# Altium footprint library PRL_PDC.PcbLib: 77 footprints (part 1 of 5)
Each footprint in its own frame and in the unit in brackets; x right, y up, seen from the top. Pads: shape width x height; smd on the part's side, far side on the other; paste and mask are expansions set on the pad; w line width, h text height; cw(c..) or ccw(c..) is an arc to the next point about the centre after c.
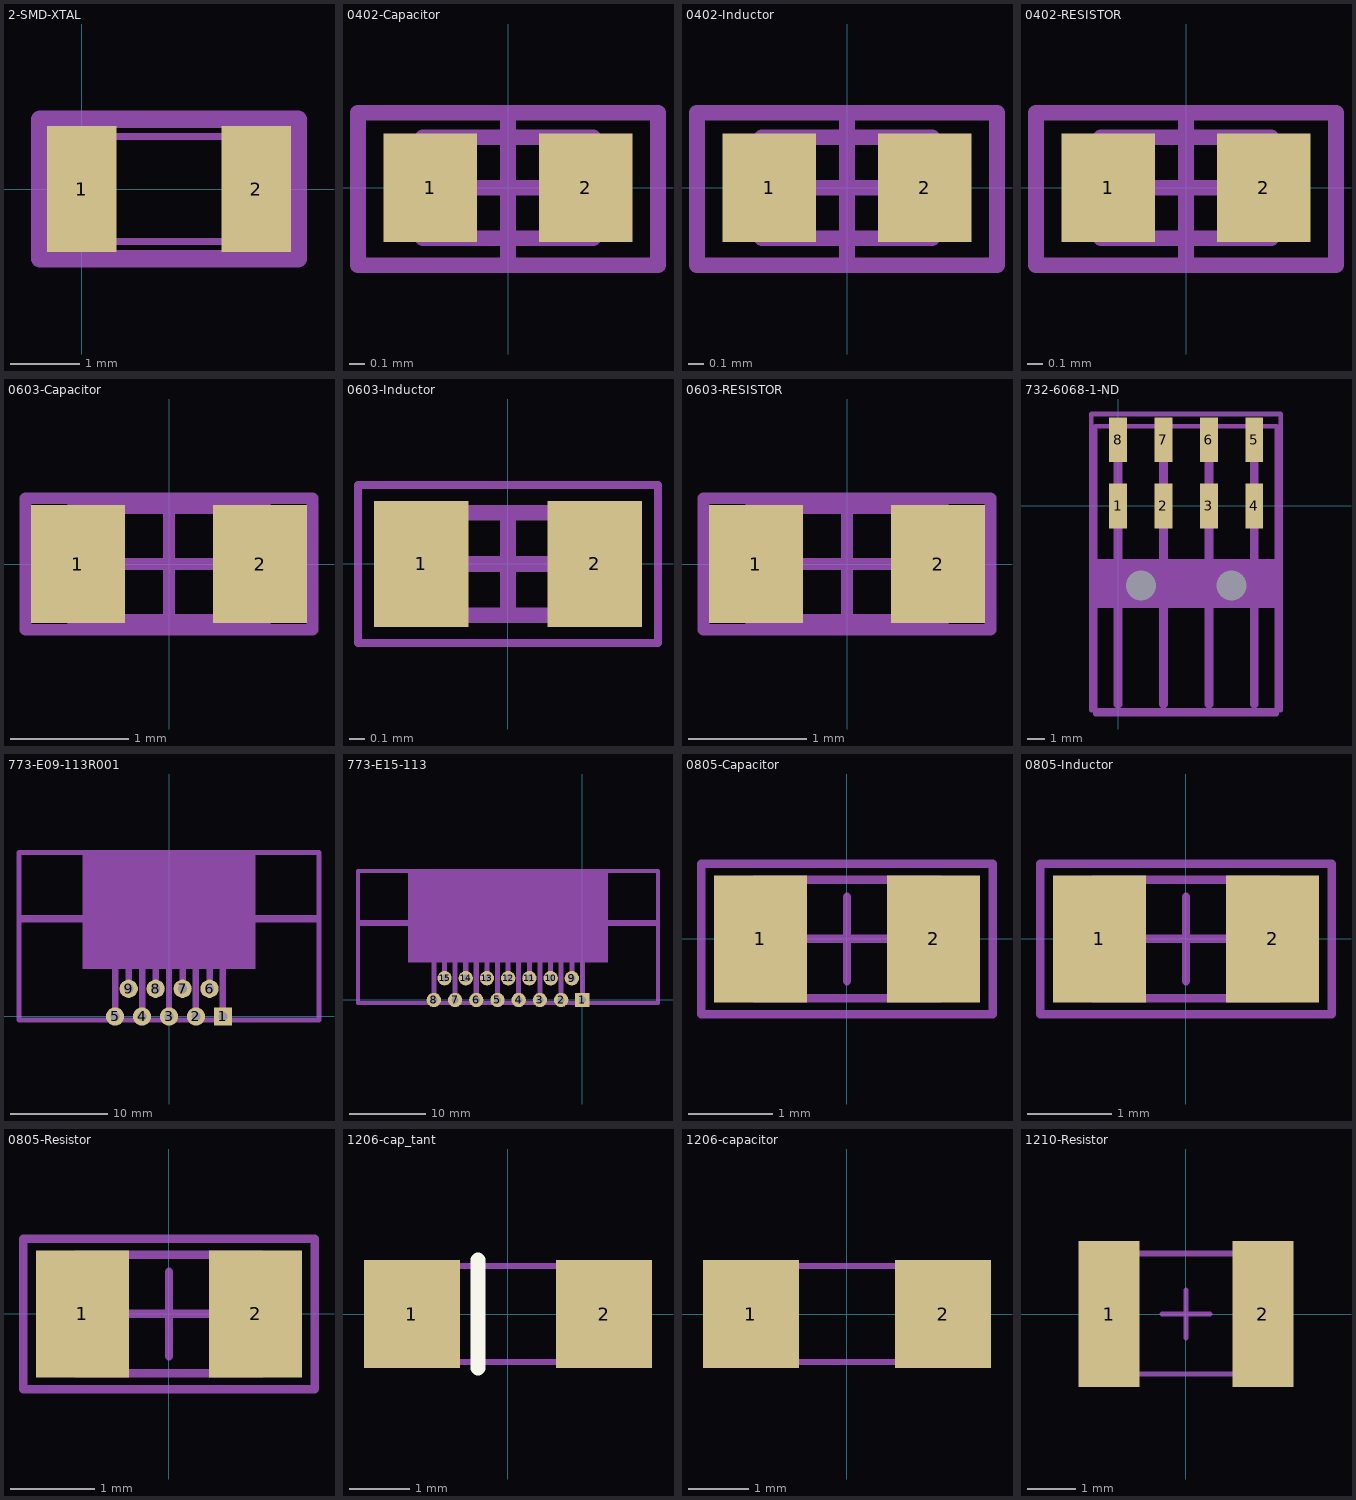
[diagram p0: the footprints below, top view; thin cyan lines are the x and y axes]

## 2-SMD-XTAL [mm]
height 1
pads (2):
  rect 1x1.8 smd paste+0: 1(0,0) 2(2.5,0)
Mechanical 1:
  lines w0.1: -0.353,-0.752 2.853,-0.752 2.853,0.752 -0.353,0.752 -0.353,-0.752
Mechanical 15:
  lines w0.254: -0.6,-1 -0.6,1 3.1,1 3.1,-1 -0.6,-1
3D body "ABS07-120.STEP": height 0.89, standoff 0, extent -0.353,-0.752 2.853,0.752

## 0402-Capacitor [mm] "Chip Capacitor, 2-Leads, Body 1,00x0,50mm, IPC Medium Density"
height 0.55
pads (2):
  rect 0.6x0.7 smd paste-0.1: 1(-0.5,0) 2(0.5,0)
Mechanical 13:
  lines w0.1: -0.55,-0.325 -0.55,0.325 0.55,0.325 0.55,-0.325 -0.55,-0.325
Mechanical 15:
  lines w0.1: -0.5,0 0.5,0 ; 0,-0.5 0,0.483 ; -0.965,-0.5 -0.965,0.483 0.965,0.483 0.965,-0.5 -0.965,-0.5
3D body "CAP0402.stp": height 0.2, standoff 0, extent -0.5,-0.3 0.5,0.3

## 0402-Inductor [mm] "0402 Inductor"
height 0.55
pads (2):
  rect 0.6x0.7 smd paste-0.1: 1(-0.5,0) 2(0.5,0)
Mechanical 13:
  lines w0.1: -0.55,-0.325 0.55,-0.325 0.55,0.325 -0.55,0.325 -0.55,-0.325
Mechanical 15:
  lines w0.1: -0.5,0 0.5,0 ; 0,-0.5 0,0.483 ; -0.965,-0.5 0.965,-0.5 0.965,0.483 -0.965,0.483 -0.965,-0.5
3D body: height 0.25, standoff -3.5, extent -0.595,0.32 -0.595,0.32
3D body "RESC-0402.stp": height 0.4, standoff 0, extent -0.525,-0.266 0.525,0.284
3D body: height 0.45, standoff 0, extent -0.4,-0.275 0.425,0.3

## 0402-RESISTOR [mm] "Resistor, Capacitor, 2-Leads, Body 1,0x0,5mm, IPC Medium Density"
height 0.35
pads (2):
  rect 0.6x0.7 smd paste-0.1: 1(-0.5,0) 2(0.5,0)
Mechanical 13:
  lines w0.1: -0.55,-0.325 0.55,-0.325 0.55,0.325 -0.55,0.325 -0.55,-0.325
Mechanical 15:
  lines w0.1: -0.5,0 0.5,0 ; 0,-0.5 0,0.483 ; -0.965,-0.5 0.965,-0.5 0.965,0.483 -0.965,0.483 -0.965,-0.5
Mechanical 30:
  lines w0.1: -0.965,-0.5 -0.965,0.483 0.965,0.483 0.965,-0.5 -0.965,-0.5
  text ".Designator" at -1.375,-0.425 h0.8
Mechanical 31:
  lines w0.1: -0.965,-0.5 -0.965,0.483 0.965,0.483 0.965,-0.5 -0.965,-0.5
  text ".Comment" at -1.425,-0.45 h0.8
3D body "RESC-0402.stp": height 0.4, standoff 0, extent -0.525,-0.275 0.525,0.275

## 0603-Capacitor [mm] "Chip Resistor, 2-Leads, Body 1,6x0,8mm, IPC Medium Density"
height 0.5
pads (2):
  rect 0.8x1 smd: 1(-0.775,0) 2(0.775,0)
Mechanical 13:
  lines w0.1: -0.825,-0.475 0.825,-0.475 0.825,0.475 -0.825,0.475 -0.825,-0.475
Mechanical 15:
  lines w0.1: -0.5,0 0.5,0 ; 0,-0.5 0,0.5 ; -1.219,-0.559 1.219,-0.559 1.219,0.559 -1.219,0.559 -1.219,-0.559
Mechanical 30:
  lines w0.1: -1.219,-0.559 -1.219,0.559 1.219,0.559 1.219,-0.559 -1.219,-0.559
  text ".Designator" at -1.675,-0.475 h0.8
Mechanical 31:
  lines w0.1: -1.219,-0.559 -1.219,0.559 1.219,0.559 1.219,-0.559 -1.219,-0.559
  text ".Comment" at -1.725,-0.5 h0.8
3D body "CAP0603.stp": height 0.3, standoff 0, extent -0.8,-0.4 0.8,0.4

## 0603-Inductor [mm] "Inductor 0603"
height 0.8
pads (2):
  rect 0.6x0.8 smd: 1(-0.55,0) 2(0.55,0)
Mechanical 13:
  lines w0.1: -0.725,-0.325 0.725,-0.325 0.725,0.325 -0.725,0.325 -0.725,-0.325
Mechanical 15:
  lines w0.05: -0.95,-0.5 0.95,-0.5 0.95,0.5 -0.95,0.5 -0.95,-0.5
  lines w0.1: -0.325,0 0.325,0 ; 0,-0.325 0,0.325
3D body: height 0.8, standoff 0, extent 0.425,-0.325 0.725,0.325
3D body: height 0.8, standoff 0, extent -0.725,-0.325 -0.425,0.325
3D body: height 0.8, standoff 0, extent -0.425,-0.325 0.425,0.325

## 0603-RESISTOR [mm] "Chip Resistor, 2-Leads, Body 1,6x0,8mm, IPC Medium Density"
height 0.5
pads (2):
  rect 0.8x1 smd: 1(-0.775,0) 2(0.775,0)
Mechanical 13:
  lines w0.1: -0.825,-0.475 -0.825,0.475 0.825,0.475 0.825,-0.475 -0.825,-0.475
Mechanical 15:
  lines w0.1: -0.5,0 0.5,0 ; 0,-0.5 0,0.5 ; -1.219,-0.559 -1.219,0.559 1.219,0.559 1.219,-0.559 -1.219,-0.559
Mechanical 30:
  lines w0.1: -1.219,-0.559 1.219,-0.559 1.219,0.559 -1.219,0.559 -1.219,-0.559
  text ".Designator" at -1.675,-0.475 h0.8
Mechanical 31:
  lines w0.1: -1.219,-0.559 1.219,-0.559 1.219,0.559 -1.219,0.559 -1.219,-0.559
  text ".Comment" at -1.725,-0.5 h0.8
3D body "RESC-0603.stp": height 0.55, standoff 0, extent -0.85,-0.45 0.85,0.45

## 732-6068-1-ND [mm] "Angle Goldpin"
height 6
pads (10):
  rect 1x2.5 smd: 1(0,0) 2(2.54,0) 3(5.08,0) 4(7.62,0) 5(7.62,3.7) 6(5.08,3.7) 7(2.54,3.7) 8(0,3.7)
  round 1.45 hole 1.68: ""(1.27,-4.45) ""(6.35,-4.45)
Mechanical 1:
  lines w0.254: -1.27,-5.575 8.89,-5.575 ; -1.27,-3.1 8.89,-3.1 ; -1.27,-11.65 -1.27,4.46 8.89,4.46 8.89,-11.65 -1.27,-11.65
Mechanical 15:
  lines w0.254: -1.5,-11.45 9.1,-11.45 9.1,5.15 -1.5,5.15 -1.5,-11.45
Mechanical 16:
  rectangle: -1.3,-5.7 8.9,-3.2
  lines w0.5: 0,-11.1 0,3.7 ; 2.54,-11.1 2.54,3.7 ; 5.08,-11.1 5.08,3.7 ; 7.62,-11.1 7.62,3.7
3D body "610108249121 (rev1).stp": height 5.14, standoff -1.34, extent -1.27,-11.7 8.89,4.46

## 773-E09-113R001 [mil] "9 Position D-Sub Plug, Male Pins Connector"
height 433.07
pads (9):
  rect 74x74 hole 37: 1(218,0)
  round 74 hole 37: 2(109,0) 3(0,0) 4(-109,0) 5(-218,0) 6(164,112) 7(55,112) 8(-54,112) 9(-163,112)
Mechanical 1:
  rectangle: -350,192 350,663.5
  lines w20: -606.5,-15 -606.5,663.5 606.5,663.5 606.5,-15 -606.5,-15
  lines w30: -596,395 599,395
Mechanical 16:
  region: -605,270
  lines w26: -218,0 -218,200 ; -163,112 -163,312 ; -109,0 -109,200 ; -54,112 -54,312 ; 0,0 0,200 ; 55,112 55,312 ; 109,0 109,200 ; 164,112 164,312 ; 218,0 218,200
3D body "773-E09-113.STEP": height 496, standoff -89.5, extent -606.5,-15 606.5,663.5

## 773-E15-113 [mil] "15Position D-Sub Plug, Male Pins Connector"
height 433.07
pads (15):
  rect 74x74 hole 37: 1(0,0)
  round 74 hole 37: 2(-109,0) 3(-218,0) 4(-327,0) 5(-436,0) 6(-545,0) 7(-654,0) 8(-763,0) 9(-54,112) 10(-163,112) 11(-272,112) 12(-381,112) 13(-490,112) 14(-599,112) 15(-708,112)
Mechanical 1:
  region: -195,663.5 -895,663.5 -895,192 -195,192
  rectangle: -568,192 132,663.5
  lines w20: -1152.5,-15 -1152.5,663.5 388.5,663.5 388.5,-15 -1152.5,-15
  lines w30: -1143.7,395 381,395
Mechanical 16:
  region: -823,270
  lines w26: -763,0 -763,200 ; -708,112 -708,312 ; -654,0 -654,200 ; -599,112 -599,312 ; -545,0 -545,200 ; -490,112 -490,312 ; -436,0 -436,200 ; -381,112 -381,312 ; -327,0 -327,200 ; -272,112 -272,312 ; -218,0 -218,200 ; -163,112 -163,312 ; -109,0 -109,200 ; -54,112 -54,312 ; 0,0 0,200
3D body "773-E15-113.STEP": height 496, standoff -89.5, extent -1152.5,-15 388.5,663.5

## 0805-Capacitor [mm] "Chip Resistor, 2-Leads, Body 2,1x1,3mm, IPC Medium Density"
height 0.5
pads (2):
  rect 1.1x1.5 smd: 1(-1.025,0) 2(1.025,0)
Mechanical 13:
  lines w0.1: -1.1,-0.7 -1.1,0.7 1.1,0.7 1.1,-0.7 -1.1,-0.7
Mechanical 15:
  lines w0.1: -0.5,0 0.5,0 ; 0,-0.5 0,0.5 ; -1.727,-0.889 1.727,-0.889 1.727,0.889 -1.727,0.889 -1.727,-0.889
Mechanical 16:
  lines w0.1: -1.727,-0.892 1.727,-0.892 ; -1.727,-0.892 -1.727,0.889 ; -1.727,-0.892 1.727,-0.892 ; -1.727,-0.892 -1.727,0.889 ; -1.727,0.889 1.727,0.889 ; -1.727,0.889 1.727,0.889 ; 1.727,-0.892 1.727,0.889 ; 1.727,-0.892 1.727,0.889
Mechanical 30:
  text ".Designator" at -1.975,-0.425 h0.8
Mechanical 31:
  text ".Comment" at -2.025,-0.45 h0.8
3D body "CAP0805.stp": height 0.78, standoff 0, extent -1,-0.625 1,0.625

## 0805-Inductor [mm] "2-Leads, Body 2,1x1,3mm, IPC Medium Density"
height 0.5
pads (2):
  rect 1.1x1.5 smd: 1(-1.025,0) 2(1.025,0)
Mechanical 13:
  lines w0.1: -1.1,-0.7 1.1,-0.7 1.1,0.7 -1.1,0.7 -1.1,-0.7
Mechanical 15:
  lines w0.1: -0.5,0 0.5,0 ; 0,-0.5 0,0.5 ; -1.727,-0.889 -1.727,0.889 1.727,0.889 1.727,-0.889 -1.727,-0.889
Mechanical 16:
  lines w0.1: -1.727,-0.892 -1.727,0.889 ; -1.727,-0.892 1.727,-0.892 ; -1.727,-0.892 -1.727,0.889 ; -1.727,-0.892 1.727,-0.892 ; -1.727,0.889 1.727,0.889 ; -1.727,0.889 1.727,0.889 ; 1.727,-0.892 1.727,0.889 ; 1.727,-0.892 1.727,0.889
Mechanical 30:
  text ".Designator" at -1.975,-0.425 h0.8
Mechanical 31:
  text ".Comment" at -2.025,-0.45 h0.8
3D body: height 0.8, standoff 0, extent 0.487,-0.712 1.113,0.713
3D body: height 0.8, standoff 0, extent -1.113,-0.712 -0.487,0.713
3D body "CAP0805.stp": height 0.78, standoff 0, extent -1,-0.625 1,0.625

## 0805-Resistor [mm] "Chip Resistor, 2-Leads, Body 2,1x1,3mm, IPC Medium Density"
height 0.5
pads (2):
  rect 1.1x1.5 smd: 1(-1.025,0) 2(1.025,0)
Mechanical 13:
  lines w0.1: -1.1,-0.7 -1.1,0.7 1.1,0.7 1.1,-0.7 -1.1,-0.7
Mechanical 15:
  lines w0.1: -0.5,0 0.5,0 ; 0,-0.5 0,0.5 ; -1.727,-0.889 1.727,-0.889 1.727,0.889 -1.727,0.889 -1.727,-0.889
Mechanical 16:
  lines w0.1: -1.727,-0.892 1.727,-0.892 ; -1.727,-0.892 -1.727,0.889 ; -1.727,-0.892 1.727,-0.892 ; -1.727,-0.892 -1.727,0.889 ; -1.727,0.889 1.727,0.889 ; -1.727,0.889 1.727,0.889 ; 1.727,-0.892 1.727,0.889 ; 1.727,-0.892 1.727,0.889
Mechanical 30:
  text ".Designator" at -1.975,-0.425 h0.8
Mechanical 31:
  text ".Comment" at -2.025,-0.45 h0.8
3D body "RESC-0805.stp": height 0.6, standoff 0, extent -1.05,-0.675 1.05,0.675

## 1206-cap_tant [mm]
height 0.5
pads (2):
  rect 1.6x1.8 smd: 1(-1.6,0) 2(1.6,0)
Top Overlay:
  lines w0.254: -0.5,-0.9 -0.5,0.9
Mechanical 13:
  lines w0.1: -1,-0.8 -1,0.8 ; 1,-0.8 1,0.8 ; -1.6,-0.8 1.6,-0.8 1.6,0.8 -1.6,0.8 -1.6,-0.8
3D body: height 1.55, standoff 0.3, extent -1,-0.7 -0.6,0.7
3D body: height 1.5, standoff 0.2, extent -1.6,-0.8 1.6,0.8

## 1206-capacitor [mm]
height 0.5
pads (2):
  rect 1.6x1.8 smd: 1(-1.6,0) 2(1.6,0)
Mechanical 13:
  lines w0.1: -1,-0.8 -1,0.8 ; 1,-0.8 1,0.8 ; -1.6,-0.8 1.6,-0.8 1.6,0.8 -1.6,0.8 -1.6,-0.8
3D body: height 1.5, standoff 0.2, extent -1.6,-0.8 1.6,0.8

## 1210-Resistor [mm] "Chip Resistor, 2-Leads"
height 0.559
pads (2):
  rect 1.27x3.048 smd: 1(-1.6,0) 2(1.6,0)
Mechanical 13:
  lines w0.1: -1.6,-1.25 -1.6,1.25 1.6,1.25 1.6,-1.25 -1.6,-1.25
Mechanical 15:
  lines w0.1: -0.5,0 0.5,0 ; 0,-0.5 0,0.5 ; -1.727,-1.25 1.727,-1.25 1.727,1.25 -1.727,1.25 -1.727,-1.25
Mechanical 16:
  lines w0.1: -1.727,-0.892 -1.727,1.27 1.727,1.27 1.727,-0.892 ; -1.727,0 -1.727,-1.25 1.727,-1.25 1.727,0
Mechanical 30:
  text ".Designator" at -1.975,-0.425 h0.8
Mechanical 31:
  text ".Comment" at -2.025,-0.45 h0.8
3D body "R1210.STEP": height 0.6, standoff 0, extent -1.6,-1.25 1.6,1.25